# Altium footprint library BARKO_PCBLIB.PcbLib: 531 footprints (part 8 of 34)
Each footprint in its own frame and in the unit in brackets; x right, y up, seen from the top. Pads: shape width x height; smd on the part's side, far side on the other; paste and mask are expansions set on the pad; w line width, h text height; cw(c..) or ccw(c..) is an arc to the next point about the centre after c.
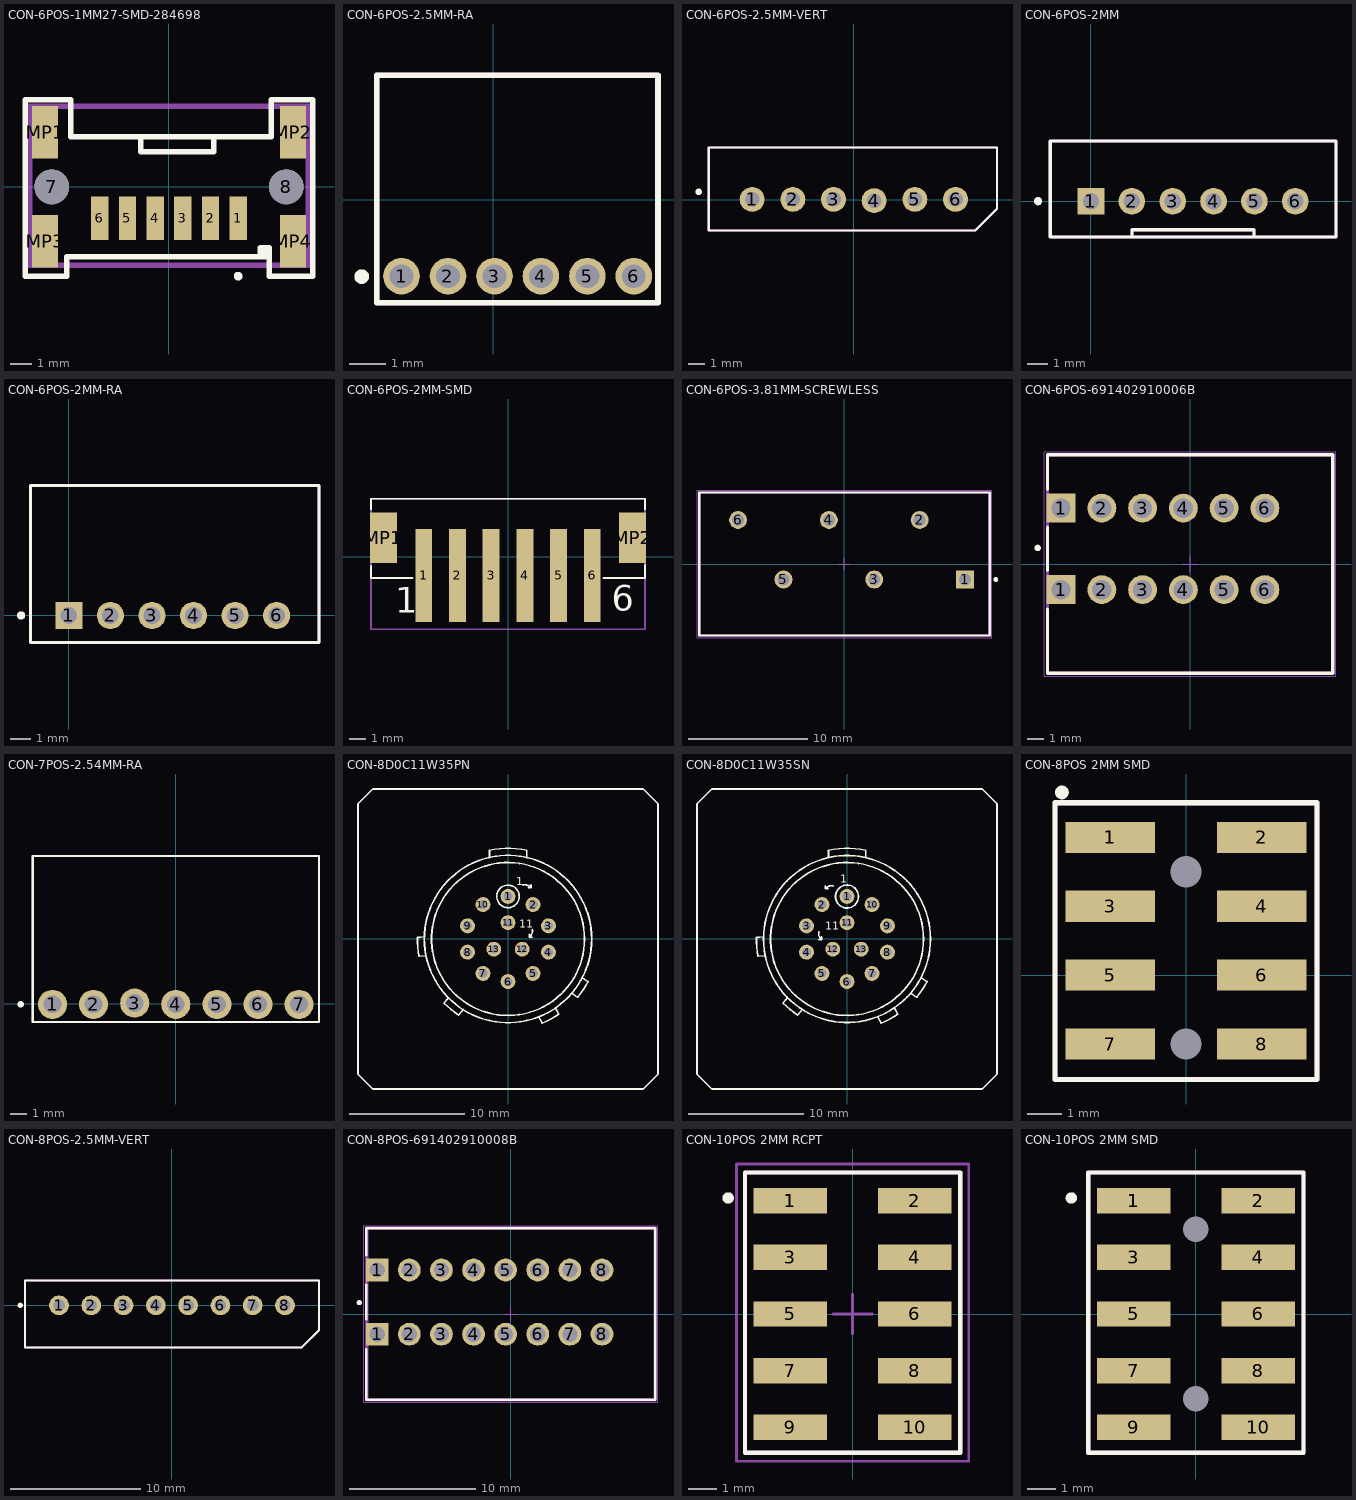
[diagram p7: the footprints below, top view; thin cyan lines are the x and y axes]

## CON-6POS-1MM27-SMD-284698 [mm] "ERNI 284698"
height 5.25
pads (12):
  rect 0.8x2 smd: 1(3.175,-1.45) 2(1.905,-1.45) 3(0.635,-1.45) 4(-0.635,-1.45) 5(-1.905,-1.45) 6(-3.175,-1.45)
  round 1.6 hole 1.6 unplated: 7(-5.385,0) 8(5.385,0)
  rect 1.2x2.4 smd: MP1(-5.685,2.5) MP2(5.685,2.5) MP3(-5.685,-2.5) MP4(5.685,-2.5)
Top Overlay:
  circle w0.2: c3.175,-4.1 r0.1
  lines w0.254: -1.305,2.3 -1.305,1.6 2.062,1.6 2.062,2.3 ; 4.16,-3.2 4.2,-3.2 4.2,-2.8 4.6,-2.8 4.6,-3.2 ; 4.4,-3 4.6,-3 4.6,-3.2 ; 4.6,-3.2 4.6,-4.1 6.6,-4.1 6.6,4 4.7,4 4.7,2.3 -4.5,2.3 -4.5,4 -6.6,4 -6.6,-4.1 -4.7,-4.1 -4.7,-3.2 4.6,-3.2
ASM Top:
  lines w0.254: -6.4,-3.6 6.4,-3.6 6.4,3.7 -6.4,3.7 -6.4,-3.6
  text ".designator" at -3.6,0.4 h0.8
3D body "284698.STEP": height 5.2, standoff -0.8, extent -6.345,-3.5 6.355,3.5

## CON-6POS-2.5MM-RA [mm]
pads (6):
  round 1 hole 0.65: 1(-2.51,-2.088) 2(-1.24,-2.088) 3(0.03,-2.088) 4(1.3,-2.088) 5(2.57,-2.088) 6(3.84,-2.088)
Top Overlay:
  circle w0.2: c-3.6,-2.1 r0.1
  lines w0.152: -3.192,-2.81 4.5,-2.81 4.5,3.4 -3.192,3.4 -3.192,-2.81
ASM Top:
  lines w0.152: -3.192,-2.81 4.5,-2.81 4.5,3.4 -3.192,3.4 -3.192,-2.81
  text ".designator" at 0,0.3 h0.8
3D body "M50-3930642.STEP": height 2.11, standoff -2.39, extent -3.192,-2.28 4.43,3.42

## CON-6POS-2.5MM-VERT [mil]
pads (6):
  round 60 hole 35: 1(-245,1.5) 2(-147,1.5) 3(-49,1.5) 4(49,-1.5) 5(147,1.5) 6(245,1.5)
Top Overlay:
  circle w7.87: c-374.02,19.68 r3.94
  lines w6: -350,-73.5 -350,126.5 345,126.5 345,-21.14 292.64,-73.5 -350,-73.5
ASM Top:
  lines w6: -350,-73.5 -350,126.5 345,126.5 345,-21.14 292.64,-73.5 -350,-73.5
  text ".designator" at -66.93,39.37 h31.5
3D body "022035065.stp": height 231.14, standoff -138.94, extent -344.04,-69.96 341,122.96

## CON-6POS-2MM [mm]
pads (6):
  rect 1.308x1.308 hole 0.8: 1(0,0)
  round 1.308 hole 0.8: 2(2.006,0) 3(4.013,0) 4(6.019,0) 5(8.026,0) 6(10.032,0)
Top Overlay:
  circle w0.2: c-2.6,0 r0.1
  lines w0.152: 2.019,-1.75 2.019,-1.4 8.013,-1.4 8.013,-1.75 ; -2,-1.75 12.032,-1.75 12.032,2.95 -2,2.95 -2,-1.75
ASM Top:
  lines w0.15: 2.019,-1.75 2.019,-1.4 8.013,-1.4 8.013,-1.75 ; -2,-1.75 -2,2.95 12.032,2.95 12.032,-1.75 -2,-1.75
  text ".designator" at 3.3,0.3 h0.8
3D body "c-440054-6-e6-3d.stp": height 6.1, standoff -3.35, extent -1.984,-1.75 12.016,2.95

## CON-6POS-2MM-RA [mm]
pads (6):
  rect 1.308x1.308 hole 0.8: 1(0,0)
  round 1.308 hole 0.8: 2(2,0) 3(4,0) 4(6,0) 5(8,0) 6(10,0)
Top Overlay:
  circle w0.2: c-2.3,0 r0.1
  lines w0.152: -1.839,-1.295 12.04,-1.295 12.04,6.248 -1.839,6.248 -1.839,-1.295
ASM Top:
  lines w0.152: -1.839,6.198 -1.788,6.248 12.04,6.248 12.04,-1.295 -1.839,-1.295 -1.839,6.248
  text ".designator" at 2.632,2.184 h0.8
3D body "S6B-PH-K-S.STEP": height 4.81, standoff -3.39, extent -1.839,-1.295 12.062,6.305

## CON-6POS-2MM-SMD [mm]
pads (8):
  rect 1x5.5 smd: 1(-5,-1.125) 2(-3,-1.125) 3(-1,-1.125) 4(1,-1.125) 5(3,-1.125) 6(5,-1.125)
  rect 1.6x3 smd mask+0.051: MP1(-7.4,1.125) MP2(7.4,1.125)
Top Overlay:
  lines w0.102: -8.128,-0.559 -8.128,-1.27 -5.664,-1.27 ; -8.128,2.794 -8.128,3.429 8.128,3.429 8.128,2.794 ; 5.664,-1.27 8.128,-1.27 8.128,-0.483
  text "6" at 6.147,-3.226 h1.52
  text "1" at -6.68,-3.327 h1.52
ASM Top:
  lines w0.102: -8.128,-4.318 8.128,-4.318 8.128,3.429 -8.128,3.429 -8.128,-4.318
  text ".designator" at -7.595,-1.168 h0.8
3D body "B6B-PH-SM4-TB.STEP": height 6.61, standoff 0.01, extent -8,-3.708 7.95,3.292

## CON-6POS-3.81MM-SCREWLESS [mm] "3.81mm 45¡ã Cable Entry Screwless, 6p"
height 13.2
pads (6):
  rect 1.5x1.5 hole 1: 1(10.12,-1.3)
  round 1.5 hole 1: 2(6.31,3.7) 3(2.5,-1.3) 4(-1.31,3.7) 5(-5.12,-1.3) 6(-8.93,3.7)
Top Overlay:
  circle w0.2: c12.7,-1.3 r0.1
  lines w0.2: -12.18,-6 12.18,-6 12.18,6 -12.18,6 -12.18,-6
Mechanical 13:
  lines w0.1: -12.18,-6 -12.18,6 12.18,6 12.18,-6 -12.18,-6
Mechanical 15:
  lines w0.05: -0.5,0 0.5,0 ; 0,-0.5 0,0.5 ; -12.38,-6.2 -12.38,6.2 12.38,6.2 12.38,-6.2 -12.38,-6.2
ASM Top:
  lines w0.2: -12.2,-6 12.2,-6 12.2,6 -12.2,6 -12.2,-6
  text ".designator" at 0,0.1 h0.8
3D body "691412320006.stp": height 13.28, standoff -3.52, extent -12.18,-6 12.18,6

## CON-6POS-691402910006B [mm] "2.54 mm - Screwless Horizontal Entry - 06p"
height 12.8
pads (12):
  rect 1.8x1.8 hole 1.2: 1(-8.04,-1.6) 1(-8.04,3.48)
  round 1.8 hole 1.2: 2(-5.5,-1.6) 2(-5.5,3.48) 3(-2.96,-1.6) 3(-2.96,3.48) 4(-0.42,-1.6) 4(-0.42,3.48) 5(2.12,-1.6) 5(2.12,3.48) 6(4.66,-1.6) 6(4.66,3.48)
Top Overlay:
  circle w0.2: c-9.5,1 r0.1
  lines w0.2: -8.89,-2.8 -8.89,-6.8 8.89,-6.8 8.89,6.8 -8.89,6.8 -8.89,4.66 ; -8.89,-0.4 -8.89,2.3
Mechanical 13:
  lines w0.1: -8.89,-6.8 -8.89,6.8 8.89,6.8 8.89,-6.8 -8.89,-6.8
Mechanical 15:
  lines w0.05: -0.5,0 0.5,0 ; 0,-0.5 0,0.5 ; -9.09,-7 9.09,-7 9.09,7 -9.09,7 -9.09,-7
ASM Top:
  lines w0.2: -8.89,-6.8 8.89,-6.8 8.89,6.8 -8.89,6.8 -8.89,-6.8
  text ".designator" at -1.829,0 h0.8
3D body "691402910006B.stp": height 12.64, standoff -3.45, extent -8.89,-6.8 8.89,6.8

## CON-7POS-2.54MM-RA [mm]
pads (7):
  round 1.8 hole 1.1: 1(-7.616,-0.038) 2(-5.084,-0.038) 3(-2.544,0.038) 4(-0.004,-0.038) 5(2.536,-0.038) 6(5.076,-0.038) 7(7.616,-0.038)
Top Overlay:
  circle w0.2: c-9.593,-0.038 r0.1
  lines w0.152: -8.834,-1.13 -8.834,9.13 8.846,9.13 8.846,-1.13 -8.834,-1.13
ASM Top:
  lines w0.152: -8.834,-1.13 -8.834,9.13 8.846,9.13 8.846,-1.13 -8.834,-1.13
  text ".designator" at -0.994,4.1 h0.8
3D body "022052071.stp": height 6.31, standoff -3.14, extent -8.739,-1.13 8.787,9.043

## CON-8D0C11W35PN [mm] "8D 13C 13#22D PIN RECP"
pads (13):
  round 1.3 hole 0.75 mask+0.05: 1(0,3.71) 2(2.181,3.001) 3(3.528,1.146) 4(3.528,-1.146) 5(2.181,-3.001) 6(0,-3.71) 7(-2.181,-3.001) 8(-3.528,-1.146) 9(-3.528,1.146) 10(-2.181,3.001) 11(0,1.42) 12(1.24,-0.89) 13(-1.24,-0.89)
Top Overlay:
  circle w0.15: c0,3.71 r0.981
  circle w0.15: c0,0 r7.291
  circle w0.15: c0,0 r6.665
  lines w0.15: -7.28,0.191 -7.892,0.137 ccw(c0,0) -7.748,-1.507 -7.137,-1.453 ; -5.192,-5.11 -5.578,-5.587 ccw(c0,0) -4.295,-6.624 -3.91,-6.148 ; -1.618,7.106 -1.618,7.734 cw(c0,0) 1.632,7.731 1.63,7.106 ; 1.3,4.7 cw(c1.469,4.084) 1.98,4.467 2,4.467 2,4.7 ; 1.762,4.467 1.99,4.467 ; 1.875,0.167 1.875,0.396 ; 2.108,0.157 1.875,0.157 1.875,0.177 ccw(c1.492,0.689) 2.108,0.857 ; 2.679,-6.783 2.967,-7.325 ccw(c0,0) 4.423,-6.549 4.136,-6.008 ; 5.551,-4.734 6.06,-5.077 ccw(c0,0) 6.981,-3.709 6.473,-3.366 ; -13.07,-11.772 -13.07,11.772 -11.772,13.07 11.772,13.07 13.07,11.772 13.07,-11.772 11.772,-13.07 -11.772,-13.07 -13.07,-11.772
  text "1" at 0.7,4.7 h0.7
  text "11" at 1,1 h0.7
3D body "8D0C11W35PN_NOT-LISTED.stp": height 33.11, standoff -3.99, extent -13.075,-13.07 13.077,13.07

## CON-8D0C11W35SN [mm] "8D 13C 13#22D PIN RECP"
pads (13):
  round 1.3 hole 0.75 mask+0.05: 1(0,3.71) 2(-2.181,3.001) 3(-3.528,1.146) 4(-3.528,-1.146) 5(-2.181,-3.001) 6(0,-3.71) 7(2.181,-3.001) 8(3.528,-1.146) 9(3.528,1.146) 10(2.181,3.001) 11(0,1.42) 12(-1.24,-0.89) 13(1.24,-0.89)
Top Overlay:
  circle w0.15: c0,3.7 r1
  circle w0.15: c0,0 r7.278
  circle w0.15: c0,0 r6.665
  lines w0.15: -7.28,0.191 -7.892,0.137 ccw(c0,0) -7.748,-1.507 -7.136,-1.453 ; -5.192,-5.11 -5.578,-5.587 ccw(c0,0) -4.295,-6.624 -3.91,-6.148 ; -2.448,-0.062 -2.215,-0.062 ; -2.448,0.638 ccw(c-1.832,0.47) -2.215,-0.041 ; -2.215,-0.051 -2.215,0.177 ; -1.9,4.617 -1.9,4.383 -1.88,4.383 cw(c-1.369,4.001) -1.2,4.617 ; -1.89,4.383 -1.662,4.383 ; 1.632,7.106 1.632,7.731 ccw(c0,0) -1.618,7.734 ; 2.679,-6.783 2.967,-7.325 ccw(c0,0) 4.423,-6.549 4.136,-6.008 ; 5.551,-4.734 6.06,-5.077 ccw(c0,0) 6.981,-3.709 6.473,-3.366 ; -1.618,7.106 -1.618,7.734 ; -1.618,7.106 -1.618,7.106 ; -1.618,7.734 -1.618,7.734 ; -13.07,-11.772 -11.772,-13.07 11.772,-13.07 13.07,-11.772 13.07,11.772 11.772,13.07 -11.772,13.07 -13.07,11.772 -13.07,-11.772
  text "1" at -0.6,4.9 h0.7
  text "11" at -1.9,0.8 h0.7
3D body "8d0c11w35sn_NOT-LISTED.stp": height 33.11, standoff -4.03, extent -13.076,-13.07 13.077,13.07

## CON-8POS 2MM SMD [mm]
pads (11):
  rect 2.6x0.9 smd: 1(-2.2,4) 1(-2.2,4) 2(2.2,4) 3(-2.2,2) 4(2.2,2) 5(-2.2,0) 6(2.2,0) 7(-2.2,-2) 8(2.2,-2)
  round 0 hole 0.9 unplated mask+0: MP1(0,3) MP2(0,-2)
Top Overlay:
  circle w0.2: c-3.6,5.3 r0.1
  lines w0.15: -3.8,4.973 -3.8,-3.027 3.8,-3.027 3.8,4.973 ; -3.8,5 3.8,5
ASM Top:
  lines w0.15: -3.8,4.973 -3.8,-3.027 3.8,-3.027 3.8,4.973 ; -3.8,5 3.8,5
  text ".designator" at 0,1 h0.8
3D body "TMM-104-01-F-D-SM.stp": height 5.98, standoff 0.01, extent -3.53,-3 3.531,5

## CON-8POS-2.5MM-VERT [mil]
pads (8):
  round 60 hole 35: 1(-343,0) 2(-245,0) 3(-147,0) 4(-49,0) 5(49,0) 6(147,0) 7(245,0) 8(343,0)
Top Overlay:
  circle w7.87: c-460.63,0 r3.94
  lines w6: -445.63,-127.63 -445.63,75.37 446.37,75.37 446.37,-75.13 393.88,-127.63 -445.63,-127.63
ASM Top:
  lines w6: -446,-128 -446,75 446,75 446,-75.5 393.5,-128 -446,-128
  text ".designator" at -51.18,-23.62 h31.5
3D body "022035085.stp": height 231.14, standoff -138.94, extent -441,-122.46 440.89,70.46

## CON-8POS-691402910008B [mm] "2.54 mm - Screwless Horizontal Entry - 08p"
height 12.8
pads (16):
  rect 1.8x1.8 hole 1.2: 1(-10.58,-1.6) 1(-10.58,3.48)
  round 1.8 hole 1.2: 2(-8.04,-1.6) 2(-8.04,3.48) 3(-5.5,-1.6) 3(-5.5,3.48) 4(-2.96,-1.6) 4(-2.96,3.48) 5(-0.42,-1.6) 5(-0.42,3.48) 6(2.12,-1.6) 6(2.12,3.48) 7(4.66,-1.6) 7(4.66,3.48) 8(7.2,-1.6) 8(7.2,3.48)
Top Overlay:
  circle w0.2: c-12,0.9 r0.1
  lines w0.2: -11.43,-2.8 -11.43,-6.8 11.43,-6.8 11.43,6.8 -11.43,6.8 -11.43,4.66 ; -11.43,-0.4 -11.43,2.3
Mechanical 13:
  lines w0.1: -11.43,-6.8 11.43,-6.8 11.43,6.8 -11.43,6.8 -11.43,-6.8
Mechanical 15:
  lines w0.05: -0.5,0 0.5,0 ; 0,-0.5 0,0.5 ; -11.63,-7 -11.63,7 11.63,7 11.63,-7 -11.63,-7
ASM Top:
  lines w0.254: -11.4,-6.8 11.4,-6.8 11.4,6.8 -11.4,6.8 -11.4,-6.8
  text ".designator" at -0.2,0 h0.8
3D body "691402910008B.stp": height 12.64, standoff -3.45, extent -11.43,-6.8 11.43,6.8

## CON-10POS 2MM RCPT [mm]
pads (11):
  rect 2.6x0.9 smd: 1(-2.2,4) 1(-2.2,4) 2(2.2,4) 3(-2.2,2) 4(2.2,2) 5(-2.2,0) 6(2.2,0) 7(-2.2,-2) 8(2.2,-2) 9(-2.2,-4) 10(2.2,-4)
Top Overlay:
  circle w0.2: c-4.4,4.1 r0.1
  lines w0.15: -3.8,-4.9 -3.8,5 3.8,5 3.8,-4.9 -3.8,-4.9
Mechanical 15:
  lines w0.1: -0.7,0 0.7,0 ; 0,-0.7 0,0.7 ; -4.1,-5.2 4.1,-5.2 4.1,5.3 -4.1,5.3 -4.1,-5.2
ASM Top:
  lines w0.15: -3.8,-4.9 3.8,-4.9 3.8,5 -3.8,5 -3.8,-4.9
  text ".designator" at 0,1 h0.8
3D body "c-1-2314844-0-5-3d.stp": height 4.63, standoff -0.05, extent -3.331,-5 3.33,5

## CON-10POS 2MM SMD [mm]
pads (13):
  rect 2.6x0.9 smd: 1(-2.2,4) 1(-2.2,4) 2(2.2,4) 3(-2.2,2) 4(2.2,2) 5(-2.2,0) 6(2.2,0) 7(-2.2,-2) 8(2.2,-2) 9(-2.2,-4) 10(2.2,-4)
  round 0 hole 0.9 unplated mask+0: MP1(0,3) MP2(0,-3)
Top Overlay:
  circle w0.2: c-4.4,4.1 r0.1
  lines w0.15: -3.8,-4.9 -3.8,5 3.8,5 3.8,-4.9 -3.8,-4.9
ASM Top:
  lines w0.15: -3.8,-4.9 3.8,-4.9 3.8,5 -3.8,5 -3.8,-4.9
  text ".designator" at 0,1 h0.8
3D body "TMM-104-01-F-D-SM.stp": height 5.98, standoff 0.01, extent -3.53,-3 3.531,5